# Altium footprint library ZJUDancer_Circuit_V4.1.PcbLib: 96 footprints (part 6 of 6)
Each footprint in its own frame and in the unit in brackets; x right, y up, seen from the top. Pads: shape width x height; smd on the part's side, far side on the other; paste and mask are expansions set on the pad; w line width, h text height; cw(c..) or ccw(c..) is an arc to the next point about the centre after c.
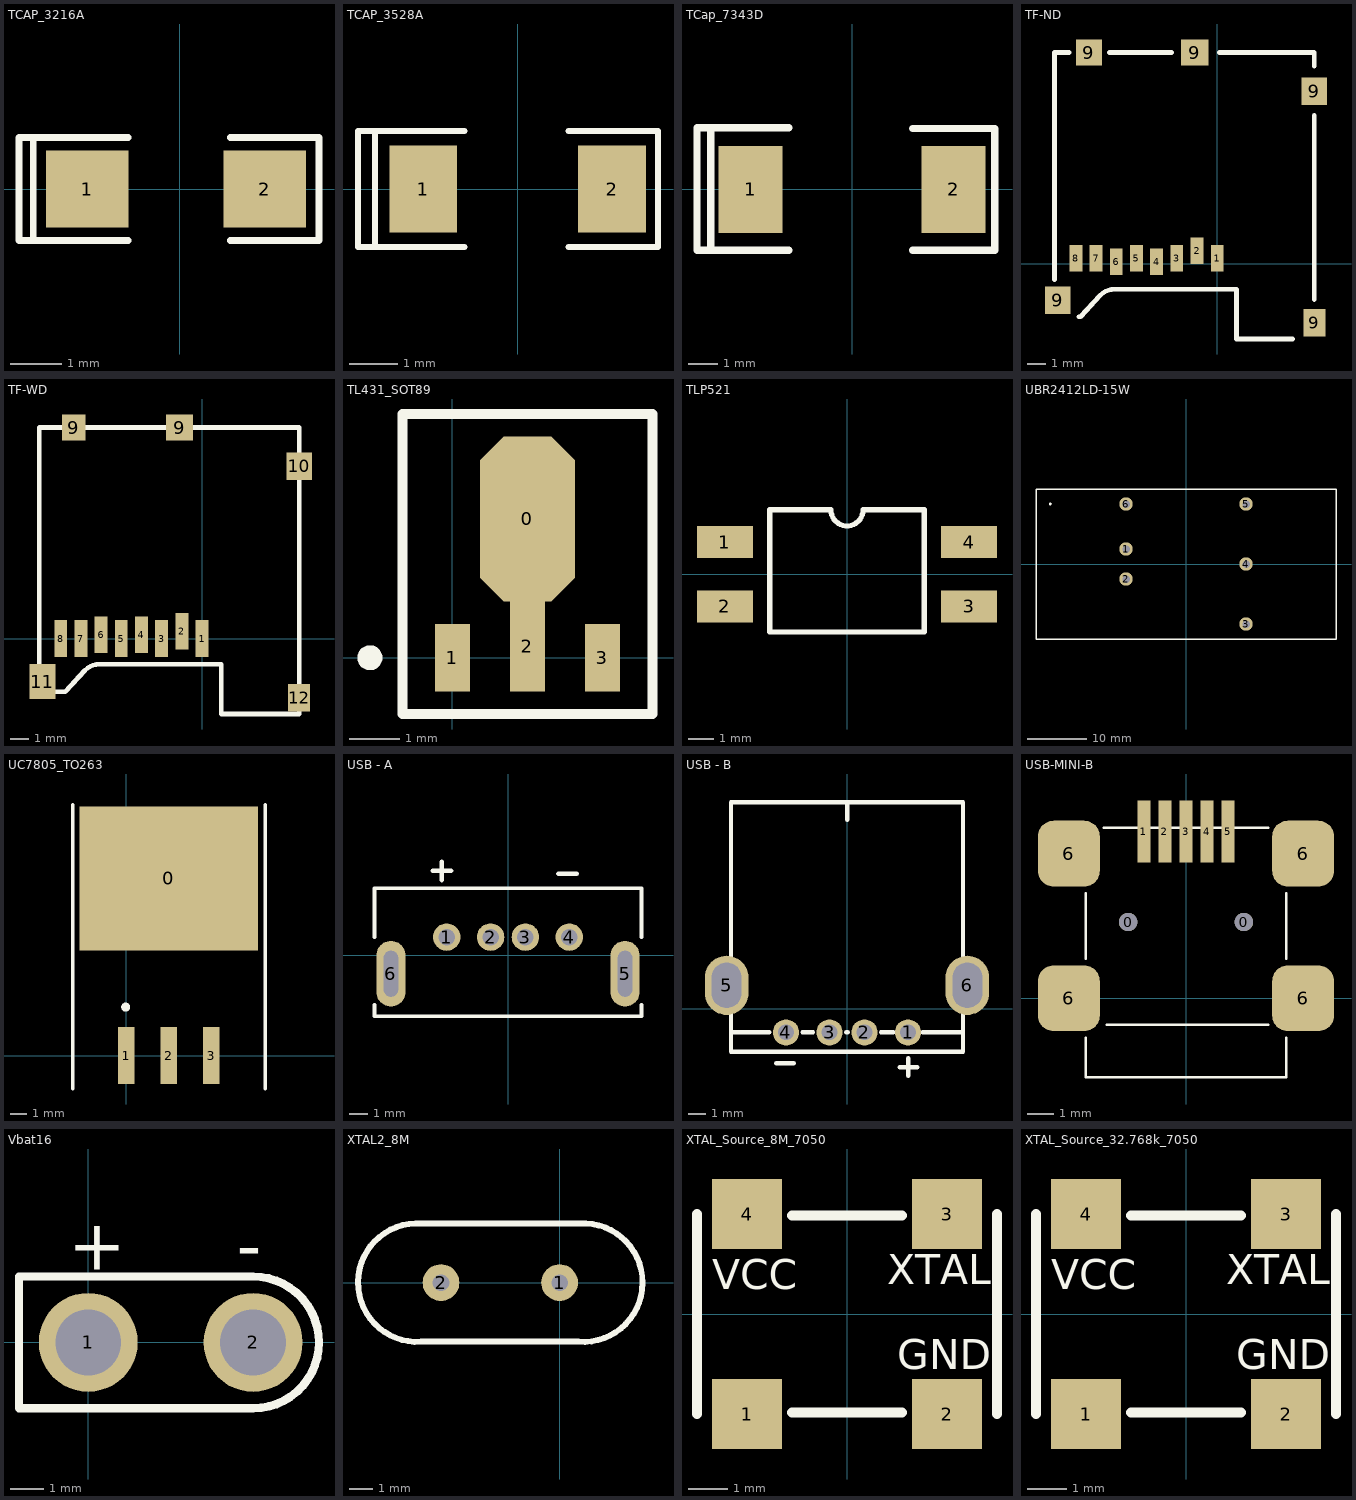
[diagram p5: the footprints below, top view; thin cyan lines are the x and y axes]

## TCAP_3216A [mm]
height 2
pads (2):
  rect 1.6x1.5 smd: 1(-1.8,0) 2(1.65,0)
Top Overlay:
  lines w0.127: -1,-1 -2.85,-1 ; -1,1 -2.85,1 ; 0.975,-1 2.7,-1 2.7,1 0.975,1 ; -2.85,-1 -3.125,-1 -3.125,1 -2.85,1 ; -2.85,-1 -2.85,1
3D body: height 1.6, standoff -0.05, extent -1.65,-0.8 1.65,0.8

## TCAP_3528A [mm]
height 2
pads (2):
  rect 1.4x1.8 smd: 1(-1.95,0) 2(1.95,0)
Top Overlay:
  lines w0.127: -1.1,-1.2 -2.95,-1.2 ; -1.1,1.2 -2.95,1.2 ; 1.05,-1.2 2.9,-1.2 2.9,1.2 1.05,1.2 ; -2.95,-1.2 -2.95,1.2 ; -2.95,-1.2 -3.3,-1.2 -3.3,1.2 -2.95,1.2
3D body: height 1.8, standoff -0.05, extent -1.8,-1.4 1.8,1.4

## TCap_7343D [mm]
height 3
pads (2):
  rect 2.2x3 smd: 1(-3.5,0) 2(3.5,0)
Top Overlay:
  lines w0.254: -4.88,-2.1 -4.88,2.125 ; -2.186,-2.1 -5.35,-2.1 -5.35,2.125 -2.186,2.125 ; 2.086,-2.1 4.925,-2.1 4.925,2.1 2.086,2.1
3D body: height 2.92, standoff 0.02, extent -3.75,-2.1 3.75,2.1

## TF-ND [mm]
pads (13):
  rect 0.7x1.45 smd: 1(0,0.287) 2(-1.1,0.687) 3(-2.2,0.287) 4(-3.3,0.087) 5(-4.4,0.287) 6(-5.5,0.087) 7(-6.6,0.287) 8(-7.7,0.287)
  rect 1.4x1.5 smd: 9(-8.7,-2) 9(5.3,9.379)
  rect 1.4x1.4 smd: 9(-6.99,11.5)
  rect 1.48x1.4 smd: 9(-1.22,11.5)
  rect 1.2x1.5 smd: 9(5.3,-3.23)
Top Overlay:
  lines w0.254: -8.868,-0.868 -8.868,11.5 -8.067,11.5 ; -7.546,-2.9 -7.452,-2.9 -6.38,-1.728 ; -6.4,-1.748 -6.38,-1.728 ; -5.869,11.5 -2.469,11.5 ; -5.588,-1.4 ccw(c-5.588,-2.52) -6.38,-1.728 ; -5.582,-1.406 1.051,-1.406 1.051,-4.115 4.119,-4.115 ; 0.13,11.5 5.3,11.5 5.3,10.753 ; 5.3,-1.961 5.3,8.078
3D body: height 1.9, standoff 0.02, extent -8.996,-3.96 5.104,11.24

## TF-WD [mm]
pads (13):
  rect 0.7x2 smd: 1(0,0) 2(-1.1,0.4) 3(-2.2,0) 4(-3.3,0.2) 5(-4.4,0) 6(-5.5,0.2) 7(-6.6,0) 8(-7.7,0)
  rect 1.3x1.4 smd: 9(-6.99,11.5)
  rect 1.48x1.4 smd: 9(-1.22,11.5)
  rect 1.4x1.5 smd: 10(5.3,9.379)
  rect 1.4x1.9 smd: 11(-8.7,-2.35)
  rect 1.2x1.5 smd: 12(5.3,-3.23)
Top Overlay:
  lines w0.254: -8.868,-2.9 -8.106,-2.9 -7.452,-2.9 -6.38,-1.728 ; -8.868,-2.8 -8.868,11.5 5.3,11.5 5.3,-4.115 1.051,-4.115 1.051,-1.406 -5.582,-1.406 ; -6.4,-1.748 -6.38,-1.728 ; -5.588,-1.4 ccw(c-5.588,-2.52) -6.38,-1.728
3D body: height 1.9, standoff 0.02, extent -9.045,-3.915 5.055,11.285

## TL431_SOT89 [mm]
pads (4):
  oct 1.9x3.3 smd: 0(1.5,2.775)
  rect 0.7x1.35 smd: 1(0,0) 3(3,0)
  rect 0.7x1.8 smd: 2(1.5,0.225)
Top Overlay:
  circle w0.25: c-1.65,0 r0.125
  lines w0.2: -1,-1.125 -1,4.875 4,4.875 4,-1.125 -1,-1.125
3D body: height 1.51, standoff 0, extent -0.75,-0.25 3.75,4.05

## TLP521 [mm]
pads (4):
  rect 2.2x1.27 smd: 1(-4.818,1.27) 2(-4.818,-1.27) 3(4.818,-1.27) 4(4.818,1.27)
Top Overlay:
  lines w0.203: -3.048,-2.286 3.048,-2.286 3.048,2.54 0.635,2.54 cw(c0,2.54) -0.635,2.54 -3.048,2.54 -3.048,-2.286
3D body: height 3.69, standoff 0.02, extent -4.85,-2.25 4.85,2.25

## UBR2412LD-15W [mil]
pads (6):
  round 90 hole 50: 1(-400,100) 2(-400,-100) 3(400,-400) 4(400,0) 5(400,400) 6(-400,400)
Top Overlay:
  circle w9.84: c-904.92,400 r4.92
  lines w10: -1000,-500 -1000,500 1000,500 1000,-500 -1000,-500
3D body: height 464.57, standoff -161.42, extent -1001.96,-499.01 998.04,500.99

## UC7805_TO263 [mm]
height 4
pads (4):
  rect 10.7x8.6 smd: 0(2.54,10.6)
  rect 1x3.4 smd: 1(0,0) 2(2.54,0) 3(5.08,0)
Top Overlay:
  circle w0.254: c-0.041,2.9 r0.141
  lines w0.2: -3.2,-2 -3.2,15 ; 8.3,-2 8.3,15
3D body: height 4.45, standoff 0, extent -2.682,-0.885 7.733,14.225

## USB - A [mm] "USB A-Type Plug , Right Angle"
pads (6):
  round 1.5 hole 0.9: 1(-3.35,1) 2(-0.95,1) 3(0.95,1) 4(3.35,1)
  oval 1.6x3.6 hole 0.8 slot 2.5 at 90 deg: 5(6.4,-1) 6(-6.4,-1)
Top Overlay:
  lines w0.2: -7.3,-2.7 -7.3,-3.325 7.3,-3.325 7.3,-2.7 ; -7.3,1 -7.3,3.675 7.3,3.675 7.3,1
  lines w0.254: -4.12,4.62 -3.12,4.62 ; -3.62,4.12 -3.62,5.12 ; 2.76,4.46 3.76,4.46
3D body: height 14.12, standoff -4.98, extent -7.3,-3.325 7.3,3.675

## USB - B [mm]
pads (6):
  round 1.5 hole 0.9: 1(3.5,-1.35) 2(1,-1.35) 3(-1,-1.35) 4(-3.5,-1.35)
  oval 2.5x3.4 hole 1.7 slot 2.6 at 90 deg: 5(-6.9,1.35) 6(6.9,1.35)
Top Overlay:
  lines w0.254: -6.65,-1.35 -4.45,-1.35 ; -4.06,-3.12 -3.06,-3.12 ; -2.55,-1.35 -1.95,-1.35 ; -0.05,-1.35 0.05,-1.35 ; 0.01,10.85 0.01,11.85 ; 1.95,-1.35 2.65,-1.35 ; 3.02,-3.34 4.02,-3.34 ; 3.52,-3.84 3.52,-2.84 ; 4.35,-1.35 6.65,-1.35 ; -6.65,-2.45 -6.65,11.85 6.65,11.85 6.65,-2.45 -6.65,-2.45
3D body: height 7.55, standoff -3.3, extent -7.895,-2.45 7.905,11.71

## USB-MINI-B [mm]
pads (11):
  round 0.7 hole 0.7: 0(-2.2,2.9) 0(2.2,2.9)
  rect 0.5x2.35 smd: 1(-1.6,6.335) 2(-0.8,6.335) 3(0,6.335) 4(0.8,6.335) 5(1.6,6.335)
  rrect50% 2.35x2.5 smd: 6(-4.45,0) 6(-4.45,5.5) 6(4.45,0) 6(4.45,5.5)
Top Overlay:
  lines w0.1: -3.81,-1.5 -3.81,-3 3.81,-3 3.81,-1.5 ; -3.81,1.5 -3.81,4 ; -3.125,6.477 3.125,6.477 ; -3,-1 3.125,-1 ; 3.81,1.5 3.81,4
3D body: height 3.97, standoff 0.02, extent -5.358,-3.258 5.342,7.142

## Vbat16 [mm]
pads (2):
  round 3 hole 2: 1(0,0) 2(5,0)
Top Overlay:
  lines w0.254: -2.1,-2 5,-2 ccw(c5,0) 5,2 -2.1,2 -2.1,-2
  text "-" at 4.5,2.2 h1.52
  text "+" at -0.6,2.2 h1.52

## XTAL2_8M [mil]
pads (2):
  round 62 hole 28: 1(0,0) 2(-200,0)
Top Overlay:
  lines w10: -232.03,99.68 ccw(c-240,0) -233.56,-99.79 -233.45,-99.68 32.02,-99.68 ; 32.03,-99.68 ccw(c40,0) 33.56,99.79 -231.91,99.79 ; -231.91,99.79 -232.03,99.68 -231.91,99.79

## XTAL_Source_8M_7050 [mil]
pads (4):
  rect 70x70 smd: 1(-100,-100) 2(100,-100) 3(100,100) 4(-100,100)
Top Overlay:
  lines w10: -150,-100 -150,100 ; -55.12,-98.43 55.12,-98.43 ; -55.12,98.43 55.12,98.43 ; 150,-100 150,100
  text "XTAL" at 40,30 h30
  text "VCC" at -135,25 h30
  text "GND" at 50,-55 h30
3D body: height 61.02, standoff -0.39, extent -138.78,-98.43 136.81,98.42

## XTAL_Source_32.768k_7050 [mil]
pads (4):
  rect 70x70 smd: 1(-100,-100) 2(100,-100) 3(100,100) 4(-100,100)
Top Overlay:
  lines w10: -150,-100 -150,100 ; -55.12,-98.43 55.12,-98.43 ; -55.12,98.43 55.12,98.43 ; 150,-100 150,100
  text "GND" at 50,-55 h30
  text "VCC" at -135,25 h30
  text "XTAL" at 40,30 h30
3D body: height 61.02, standoff -0.39, extent -138.78,-94.49 136.81,102.36